# Altium footprint library Connectors.PcbLib: 245 footprints (part 5 of 16)
Each footprint in its own frame and in the unit in brackets; x right, y up, seen from the top. Pads: shape width x height; smd on the part's side, far side on the other; paste and mask are expansions set on the pad; w line width, h text height; cw(c..) or ccw(c..) is an arc to the next point about the centre after c.
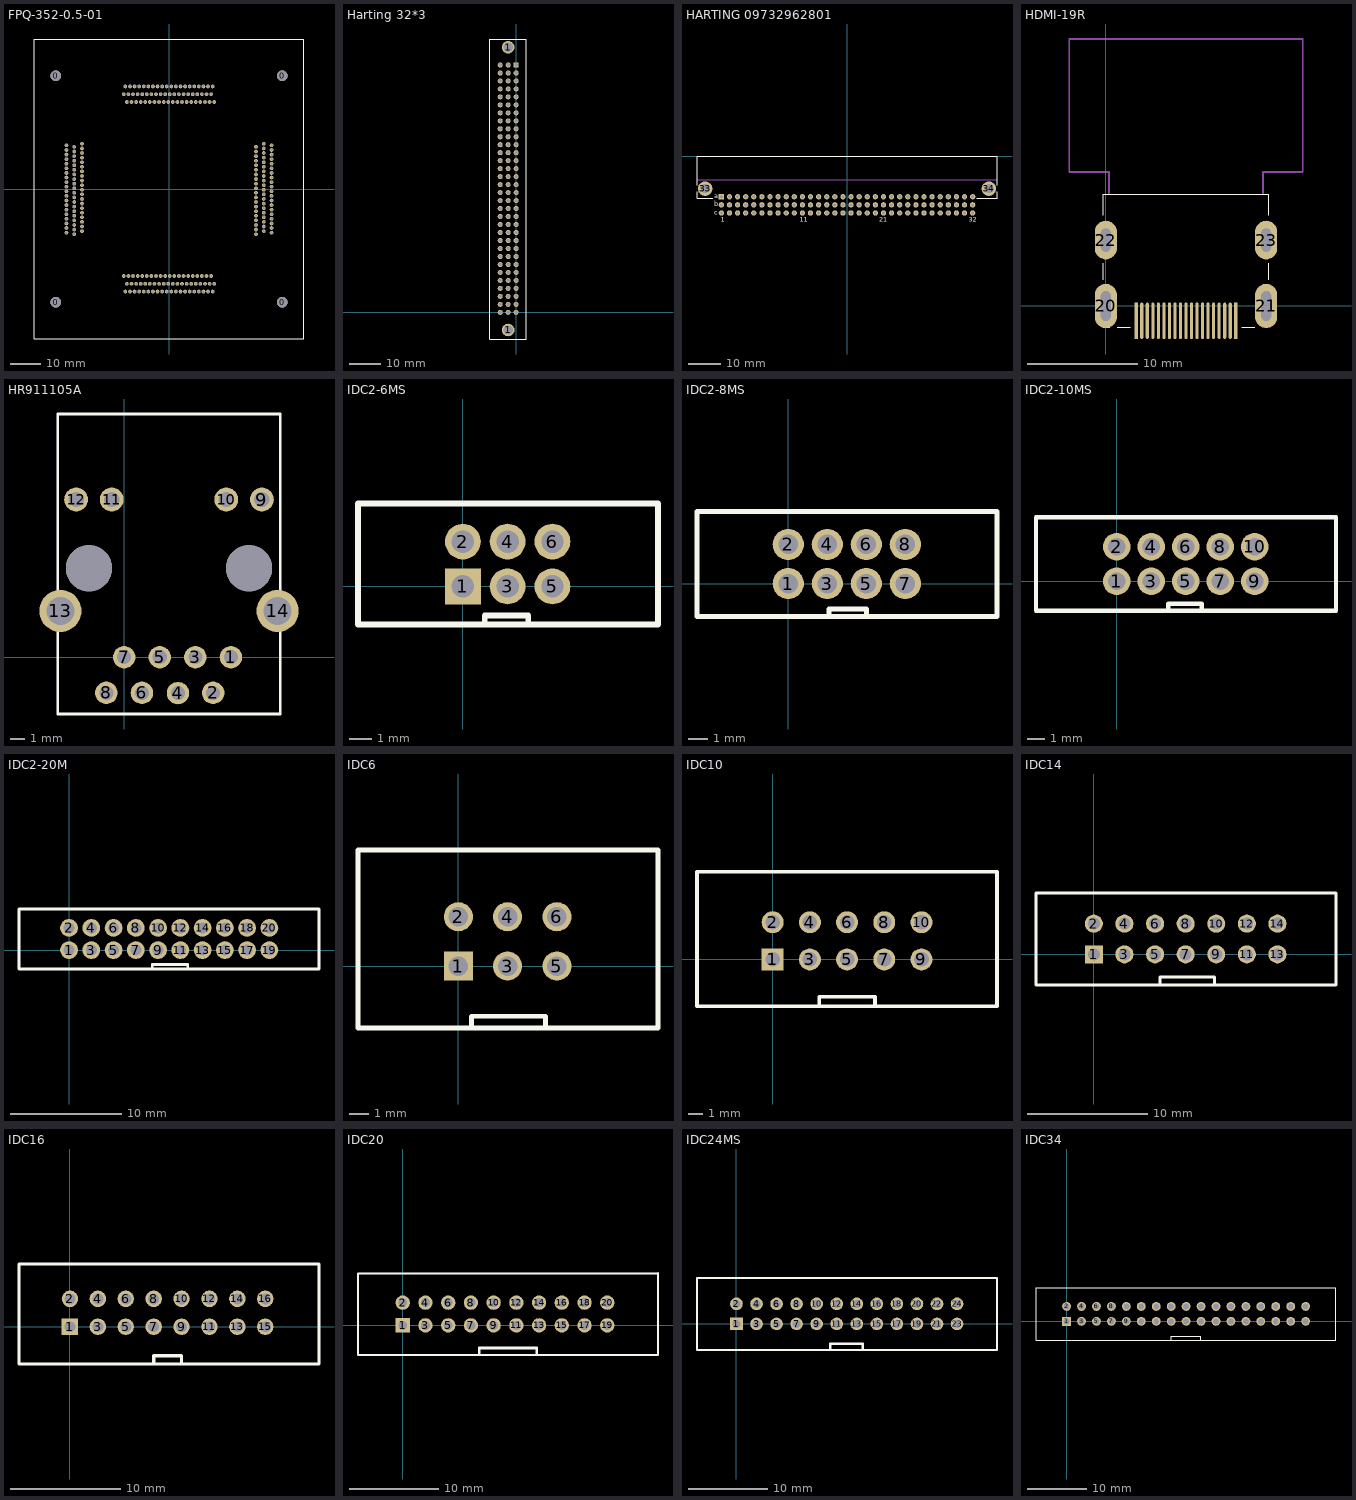
[diagram p4: the footprints below, top view; thin cyan lines are the x and y axes]

## FPQ-352-0.5-01 [mm] "IS_socket-240pin"
height 24
pads (244):
  round 3.5 hole 3.5: 0(-37,-37) 0(-37,37) 0(37,-37) 0(37,37)
  round 1.2 hole 0.8: 1(-14.75,-28.42) 2(-14.25,-33.5) 3(-13.75,-30.96) 4(-13.25,-28.42) 5(-12.75,-33.5) 6(-12.25,-30.96) 7(-11.75,-28.42) 8(-11.25,-33.5) 9(-10.75,-30.96) 10(-10.25,-28.42) 11(-9.75,-33.5) 12(-9.25,-30.96) 13(-8.75,-28.42) 14(-8.25,-33.5) 15(-7.75,-30.96) 16(-7.25,-28.42) 17(-6.75,-33.5) 18(-6.25,-30.96) 19(-5.75,-28.42) 20(-5.25,-33.5) 21(-4.75,-30.96) 22(-4.25,-28.42) 23(-3.75,-33.5) 24(-3.25,-30.96) 25(-2.75,-28.42) 26(-2.25,-33.5) 27(-1.75,-30.96) 28(-1.25,-28.42) 29(-0.75,-33.5) 30(-0.25,-30.96) 31(0.25,-28.42) 32(0.75,-33.5) 33(1.25,-30.96) 34(1.75,-28.42) 35(2.25,-33.5) 36(2.75,-30.96) 37(3.25,-28.42) 38(3.75,-33.5) 39(4.25,-30.96) 40(4.75,-28.42) 41(5.25,-33.5) 42(5.75,-30.96) 43(6.25,-28.42) 44(6.75,-33.5) 45(7.25,-30.96) 46(7.75,-28.42) 47(8.25,-33.5) 48(8.75,-30.96) 49(9.25,-28.42) 50(9.75,-33.5) 51(10.25,-30.96) 52(10.75,-28.42) 53(11.25,-33.5) 54(11.75,-30.96) 55(12.25,-28.42) 56(12.75,-33.5) 57(13.25,-30.96) 58(13.75,-28.42) 59(14.25,-33.5) 60(14.75,-30.96) 61(28.42,-14.75) 62(33.5,-14.25) 63(30.96,-13.75) 64(28.42,-13.25) 65(33.5,-12.75) 66(30.96,-12.25) 67(28.42,-11.75) 68(33.5,-11.25) 69(30.96,-10.75) 70(28.42,-10.25) 71(33.5,-9.75) 72(30.96,-9.25) 73(28.42,-8.75) 74(33.5,-8.25) 75(30.96,-7.75) 76(28.42,-7.25) 77(33.5,-6.75) 78(30.96,-6.25) 79(28.42,-5.75) 80(33.5,-5.25) 81(30.96,-4.75) 82(28.42,-4.25) 83(33.5,-3.75) 84(30.96,-3.25) 85(28.42,-2.75) 86(33.5,-2.25) 87(30.96,-1.75) 88(28.42,-1.25) 89(33.5,-0.75) 90(30.96,-0.25) 91(28.42,0.25) 92(33.5,0.75) 93(30.96,1.25) 94(28.42,1.75) 95(33.5,2.25) 96(30.96,2.75) 97(28.42,3.25) 98(33.5,3.75) 99(30.96,4.25) 100(28.42,4.75) 101(33.5,5.25) 102(30.96,5.75) 103(28.42,6.25) 104(33.5,6.75) 105(30.96,7.25) 106(28.42,7.75) 107(33.5,8.25) 108(30.96,8.75) 109(28.42,9.25) 110(33.5,9.75) 111(30.96,10.25) 112(28.42,10.75) 113(33.5,11.25) 114(30.96,11.75) 115(28.42,12.25) 116(33.5,12.75) 117(30.96,13.25) 118(28.42,13.75) 119(33.5,14.25) 120(30.96,14.75) 121(14.75,28.42) 122(14.25,33.5) 123(13.75,30.96) 124(13.25,28.42) 125(12.75,33.5) 126(12.25,30.96) 127(11.75,28.42) 128(11.25,33.5) 129(10.75,30.96) 130(10.25,28.42) 131(9.75,33.5) 132(9.25,30.96) 133(8.75,28.42) 134(8.25,33.5) 135(7.75,30.96) 136(7.25,28.42) 137(6.75,33.5) 138(6.25,30.96) 139(5.75,28.42) 140(5.25,33.5) 141(4.75,30.96) 142(4.25,28.42) 143(3.75,33.5) 144(3.25,30.96) 145(2.75,28.42) 146(2.25,33.5) 147(1.75,30.96) 148(1.25,28.42) 149(0.75,33.5) 150(0.25,30.96) 151(-0.25,28.42) 152(-0.75,33.5) 153(-1.25,30.96) 154(-1.75,28.42) 155(-2.25,33.5) 156(-2.75,30.96) 157(-3.25,28.42) 158(-3.75,33.5) 159(-4.25,30.96) 160(-4.75,28.42) 161(-5.25,33.5) 162(-5.75,30.96) 163(-6.25,28.42) 164(-6.75,33.5) 165(-7.25,30.96) 166(-7.75,28.42) 167(-8.25,33.5) 168(-8.75,30.96) 169(-9.25,28.42) 170(-9.75,33.5) 171(-10.25,30.96) 172(-10.75,28.42) 173(-11.25,33.5) 174(-11.75,30.96) 175(-12.25,28.42) 176(-12.75,33.5) 177(-13.25,30.96) 178(-13.75,28.42) 179(-14.25,33.5) 180(-14.75,30.96) 181(-28.42,14.75) 182(-33.5,14.25) 183(-30.96,13.75) 184(-28.42,13.25) 185(-33.5,12.75) 186(-30.96,12.25) 187(-28.42,11.75) 188(-33.5,11.25) 189(-30.96,10.75) 190(-28.42,10.25) 191(-33.5,9.75) 192(-30.96,9.25) 193(-28.42,8.75) 194(-33.5,8.25) 195(-30.96,7.75) 196(-28.42,7.25) 197(-33.5,6.75) 198(-30.96,6.25) 199(-28.42,5.75) 200(-33.5,5.25) 201(-30.96,4.75) 202(-28.42,4.25) 203(-33.5,3.75) 204(-30.96,3.25) 205(-28.42,2.75) 206(-33.5,2.25) 207(-30.96,1.75) 208(-28.42,1.25) 209(-33.5,0.75) 210(-30.96,0.25) 211(-28.42,-0.25) 212(-33.5,-0.75) 213(-30.96,-1.25) 214(-28.42,-1.75) 215(-33.5,-2.25) 216(-30.96,-2.75) 217(-28.42,-3.25) 218(-33.5,-3.75) 219(-30.96,-4.25) 220(-28.42,-4.75) 221(-33.5,-5.25) 222(-30.96,-5.75) 223(-28.42,-6.25) 224(-33.5,-6.75) 225(-30.96,-7.25) 226(-28.42,-7.75) 227(-33.5,-8.25) 228(-30.96,-8.75) 229(-28.42,-9.25) 230(-33.5,-9.75) 231(-30.96,-10.25) 232(-28.42,-10.75) 233(-33.5,-11.25) 234(-30.96,-11.75) 235(-28.42,-12.25) 236(-33.5,-12.75) 237(-30.96,-13.25) 238(-28.42,-13.75) 239(-33.5,-14.25) 240(-30.96,-14.75)
Top Overlay:
  lines w0.1: -44,-49 44,-49 44,49 -44,49 -44,-49
3D body: height 24, standoff 0, extent -44,-49 44,49

## Harting 32*3 [mm]
pads (98):
  round 4 hole 3: 1(-2.54,-5.63) 1(-2.54,84.37)
  rect 1.6x1.6 hole 1.1: a1(0,78.74)
  round 1.6 hole 1.1: a2(0,76.2) a3(0,73.66) a4(0,71.12) a5(0,68.58) a6(0,66.04) a7(0,63.5) a8(0,60.96) a9(0,58.42) a10(0,55.88) a11(0,53.34) a12(0,50.8) a13(0,48.26) a14(0,45.72) a15(0,43.18) a16(0,40.64) a17(0,38.1) a18(0,35.56) a19(0,33.02) a20(0,30.48) a21(0,27.94) a22(0,25.4) a23(0,22.86) a24(0,20.32) a25(0,17.78) a26(0,15.24) a27(0,12.7) a28(0,10.16) a29(0,7.62) a30(0,5.08) a31(0,2.54) a32(0,0) b1(-2.54,78.74) b2(-2.54,76.2) b3(-2.54,73.66) b4(-2.54,71.12) b5(-2.54,68.58) b6(-2.54,66.04) b7(-2.54,63.5) b8(-2.54,60.96) b9(-2.54,58.42) b10(-2.54,55.88) b11(-2.54,53.34) b12(-2.54,50.8) b13(-2.54,48.26) b14(-2.54,45.72) b15(-2.54,43.18) b16(-2.54,40.64) b17(-2.54,38.1) b18(-2.54,35.56) b19(-2.54,33.02) b20(-2.54,30.48) b21(-2.54,27.94) b22(-2.54,25.4) b23(-2.54,22.86) b24(-2.54,20.32) b25(-2.54,17.78) b26(-2.54,15.24) b27(-2.54,12.7) b28(-2.54,10.16) b29(-2.54,7.62) b30(-2.54,5.08) b31(-2.54,2.54) b32(-2.54,0) c1(-5.08,78.74) c2(-5.08,76.2) c3(-5.08,73.66) c4(-5.08,71.12) c5(-5.08,68.58) c6(-5.08,66.04) c7(-5.08,63.5) c8(-5.08,60.96) c9(-5.08,58.42) c10(-5.08,55.88) c11(-5.08,53.34) c12(-5.08,50.8) c13(-5.08,48.26) c14(-5.08,45.72) c15(-5.08,43.18) c16(-5.08,40.64) c17(-5.08,38.1) c18(-5.08,35.56) c19(-5.08,33.02) c20(-5.08,30.48) c21(-5.08,27.94) c22(-5.08,25.4) c23(-5.08,22.86) c24(-5.08,20.32) c25(-5.08,17.78) c26(-5.08,15.24) c27(-5.08,12.7) c28(-5.08,10.16) c29(-5.08,7.62) c30(-5.08,5.08) c31(-5.08,2.54) c32(-5.08,0)
Top Overlay:
  lines w0.254: -8.4,-8.5 -8.4,87 3.2,87 3.2,-8.5 -8.4,-8.5

## HARTING 09732962801 [mm] "Connector; DIN 41612"
height 11.1
pads (98):
  round 4.6 hole 2.8: 33(-44.45,-10.1) 34(44.45,-10.1)
  rect 1.65x1.65 hole 1: A1(-39.37,-12.64)
  round 1.65 hole 1: A2(-36.83,-12.64) A3(-34.29,-12.64) A4(-31.75,-12.64) A5(-29.21,-12.64) A6(-26.67,-12.64) A7(-24.13,-12.64) A8(-21.59,-12.64) A9(-19.05,-12.64) A10(-16.51,-12.64) A11(-13.97,-12.64) A12(-11.43,-12.64) A13(-8.89,-12.64) A14(-6.35,-12.64) A15(-3.81,-12.64) A16(-1.27,-12.64) A17(1.27,-12.64) A18(3.81,-12.64) A19(6.35,-12.64) A20(8.89,-12.64) A21(11.43,-12.64) A22(13.97,-12.64) A23(16.51,-12.64) A24(19.05,-12.64) A25(21.59,-12.64) A26(24.13,-12.64) A27(26.67,-12.64) A28(29.21,-12.64) A29(31.75,-12.64) A30(34.29,-12.64) A31(36.83,-12.64) A32(39.37,-12.64) B1(-39.37,-15.18) B2(-36.83,-15.18) B3(-34.29,-15.18) B4(-31.75,-15.18) B5(-29.21,-15.18) B6(-26.67,-15.18) B7(-24.13,-15.18) B8(-21.59,-15.18) B9(-19.05,-15.18) B10(-16.51,-15.18) B11(-13.97,-15.18) B12(-11.43,-15.18) B13(-8.89,-15.18) B14(-6.35,-15.18) B15(-3.81,-15.18) B16(-1.27,-15.18) B17(1.27,-15.18) B18(3.81,-15.18) B19(6.35,-15.18) B20(8.89,-15.18) B21(11.43,-15.18) B22(13.97,-15.18) B23(16.51,-15.18) B24(19.05,-15.18) B25(21.59,-15.18) B26(24.13,-15.18) B27(26.67,-15.18) B28(29.21,-15.18) B29(31.75,-15.18) B30(34.29,-15.18) B31(36.83,-15.18) B32(39.37,-15.18) C1(-39.37,-17.72) C2(-36.83,-17.72) C3(-34.29,-17.72) C4(-31.75,-17.72) C5(-29.21,-17.72) C6(-26.67,-17.72) C7(-24.13,-17.72) C8(-21.59,-17.72) C9(-19.05,-17.72) C10(-16.51,-17.72) C11(-13.97,-17.72) C12(-11.43,-17.72) C13(-8.89,-17.72) C14(-6.35,-17.72) C15(-3.81,-17.72) C16(-1.27,-17.72) C17(1.27,-17.72) C18(3.81,-17.72) C19(6.35,-17.72) C20(8.89,-17.72) C21(11.43,-17.72) C22(13.97,-17.72) C23(16.51,-17.72) C24(19.05,-17.72) C25(21.59,-17.72) C26(24.13,-17.72) C27(26.67,-17.72) C28(29.21,-17.72) C29(31.75,-17.72) C30(34.29,-17.72) C31(36.83,-17.72) C32(39.37,-17.72)
Top Overlay:
  lines w0.2: -47,-11.1 -47,-13.14 -42.07,-13.14 ; -47,-9.1 -47,0 47,0 47,-9.1 ; 40.595,-13.14 47,-13.14 47,-11.1
  text "21" at 10.18,-20.42 h1.5
  text "11" at -14.845,-20.42 h1.5
  text "32" at 38.12,-20.42 h1.5
  text "c" at -41.58,-18.22 h1.5
  text "b" at -41.58,-15.68 h1.5
  text "a" at -41.58,-13.14 h1.5
  text "1" at -39.62,-20.42 h1.5
Mechanical 1:
  lines w0.1: -47,-7.34 47,-7.34
  text "PCB Edge" at -46.47,-6.84 h0.6
3D body "09 73 296 2801.STP": height 9.17, standoff -2.73, extent -47.03,-18.05 46.97,0.07

## HDMI-19R [mm]
pads (23):
  rect 0.28x3.3 smd: 1(2.75,-1.335) 19(11.75,-1.335)
  oval 0.28x3.3 smd: 2(3.25,-1.335) 3(3.75,-1.335) 4(4.25,-1.335) 5(4.75,-1.335) 6(5.25,-1.335) 7(5.75,-1.335) 8(6.25,-1.335) 9(6.75,-1.335) 10(7.25,-1.335) 11(7.75,-1.335) 12(8.25,-1.335) 13(8.75,-1.335) 14(9.25,-1.335) 15(9.75,-1.335) 16(10.25,-1.335) 17(10.75,-1.335) 18(11.25,-1.335)
  oval 2x4 hole 0.9 slot 2.7 at 90 deg: 20(0,0) 21(14.5,0)
  oval 2x3.5 hole 0.9 slot 2.1 at 90 deg: 22(0,5.96) 23(14.5,5.96)
Top Overlay:
  lines w0.1: -0.25,-1.91 0.369,-1.91 ; -0.25,2.36 -0.25,3.85 ; -0.25,8.225 -0.25,10.09 14.75,10.09 14.75,8.225 ; 1.025,-1.91 2.225,-1.91 ; 12.275,-1.91 13.475,-1.91 ; 14.75,2.36 14.75,3.85
Mechanical 1:
  lines w0.15: 0.293,10.217 0.293,12.118 -3.3,12.118 -3.3,24.142 17.8,24.142 17.8,12.118 14.207,12.118 14.207,10.217
  text "Габбариты ответной части" at -0.722,21.97 h1.6
3D body "1747981-1.stp": height 6.03, standoff -2.25, extent -0.25,-1.91 14.75,10.09

## HR911105A [mm]
pads (16):
  round 1.6 hole 1: 1(7.62,0) 2(6.35,-2.54) 3(5.08,0) 4(3.84,-2.56) 5(2.54,0) 6(1.27,-2.54) 7(0,0) 8(-1.27,-2.54)
  round 1.7 hole 1.1: 9(9.825,11.25) 10(7.285,11.25) 11(-0.885,11.25) 12(-3.425,11.25)
  round 3 hole 2: 13(-4.545,3.3) 14(10.945,3.3)
  round 3.3 hole 3.3: ""(-2.515,6.35) ""(8.915,6.35)
Top Overlay:
  lines w0.2: 3.2,-2.56 3.84,-2.56 ; -4.74,-4.05 -4.74,17.35 3.2,17.35 11.14,17.35 11.14,-4.05 3.2,-4.05 -4.74,-4.05
3D body "User Library-HR911105A.step": height 14, standoff -2.5, extent -4.78,-4.1 11.1,17.3

## IDC2-6MS [mm]
pads (6):
  rect 1.6x1.6 hole 1: 1(0,0)
  round 1.6 hole 1: 2(0,2) 3(2,0) 4(2,2) 5(4,0) 6(4,2)
Top Overlay:
  lines w0.254: 0.98,-1.7 0.98,-1.3 2.92,-1.3 2.92,-1.67 ; 8.7,-1.7 -4.68,-1.7 -4.68,3.7 8.7,3.7 ; 8.71,-1.7 8.71,3.7
3D body: height 1.4, standoff 0, extent -4.5,-1.7 8.5,3.8
3D body: height 5.4, standoff -1.5, extent 3.74,-0.26 4.26,0.26
3D body: height 5.4, standoff -1.5, extent 3.74,1.74 4.26,2.26
3D body: height 5.4, standoff -1.5, extent 1.74,-0.26 2.26,0.26
3D body: height 5.4, standoff -1.5, extent 1.74,1.74 2.26,2.26
3D body: height 5.4, standoff -1.5, extent -0.26,-0.26 0.26,0.26
3D body: height 5.4, standoff -1.5, extent -0.26,1.74 0.26,2.26
3D body: height 2.5, standoff 0, extent -4.5,-1.8 8.5,-1.48
3D body: height 5.7, standoff 0, extent 8.18,-1.8 8.5,3.8
3D body: height 5.7, standoff 0, extent -4.5,-1.8 -4.18,3.8
3D body: height 5.7, standoff 0, extent 2.97,-1.8 8.5,-1.48
3D body: height 5.7, standoff 0, extent -4.5,-1.8 1.03,-1.48
3D body: height 5.7, standoff 0, extent -4.5,3.48 8.5,3.8

## IDC2-8MS [mm]
pads (8):
  round 1.6 hole 1: 1(0,0) 2(0,2) 3(2,0) 4(2,2) 5(4,0) 6(4,2) 7(6,0) 8(6,2)
Top Overlay:
  lines w0.254: 2.08,-1.7 2.08,-1.3 4.02,-1.3 4.02,-1.67 ; -4.68,-1.7 10.7,-1.7 10.7,3.7 -4.68,3.7 -4.68,-1.7
3D body "User Library-BHS2-8.STEP": height 7.2, standoff -2, extent -4.6,-1.75 10.6,3.75

## IDC2-10MS [mm]
pads (10):
  round 1.6 hole 1: 1(0,0) 2(0,2) 3(2,0) 4(2,2) 5(4,0) 6(4,2) 7(6,0) 8(6,2) 9(8,0) 10(8,2)
Top Overlay:
  lines w0.254: 2.98,-1.7 2.98,-1.3 4.92,-1.3 4.92,-1.67 ; -4.68,-1.7 -4.68,3.7 12.71,3.7 12.71,-1.7 -4.68,-1.7
3D body "User Library-IDC2-10.step": height 5.6, standoff -3.6, extent -4.54,-1.78 12.56,3.72

## IDC2-20M [mm]
pads (20):
  round 1.6 hole 1: 1(0,0) 2(0,2) 3(2,0) 4(2,2) 5(4,0) 6(4,2) 7(6,0) 8(6,2) 9(8,0) 10(8,2) 11(10,0) 12(10,2) 13(12,0) 14(12,2) 15(14,0) 16(14,2) 17(16,0) 18(16,2) 19(18,0) 20(18,2)
Top Overlay:
  lines w0.254: 7.48,-1.7 7.48,-1.3 10.67,-1.3 10.67,-1.67 ; -4.5,-1.7 -4.5,3.7 22.46,3.7 22.46,-1.7 -4.5,-1.7
3D body "User Library-BH2-xx10-64.step": height 5.65, standoff -3.6, extent -4.5,-1.755 22.5,3.695

## IDC6 [mm]
height 10
pads (6):
  rect 1.5x1.5 hole 1: 1(0,0)
  round 1.5 hole 1: 2(0,2.54) 3(2.54,0) 4(2.54,2.54) 5(5.08,0) 6(5.08,2.54)
Top Overlay:
  lines w0.254: 0.69,-3.17 0.69,-2.585 4.5,-2.585 4.5,-3.14 ; -5.17,-3.19 -5.17,5.98 10.29,5.98 10.29,-3.19 -5.17,-3.19
3D body "User Library-Header2x3-shrouded-vertical.step": height 9.1, standoff -3.1, extent -5.11,-3.085 10.13,6.365

## IDC10 [mm]
height 10
pads (10):
  rect 1.5x1.5 hole 1: 1(0,0)
  round 1.5 hole 1: 2(0,2.54) 3(2.54,0) 4(2.54,2.54) 5(5.08,0) 6(5.08,2.54) 7(7.62,0) 8(7.62,2.54) 9(10.16,0) 10(10.16,2.54)
Top Overlay:
  lines w0.254: 3.175,-3.14 3.175,-2.555 6.985,-2.555 6.985,-3.11 ; -5.17,-3.19 15.32,-3.19 15.32,5.98 -5.17,5.98 -5.17,-3.19
3D body "User Library-BH-10__64.step": height 9.1, standoff -3, extent -5.13,-3.35 15.37,5.95

## IDC14 [mm]
height 10
pads (14):
  rect 1.5x1.5 hole 1: 1(0,0)
  round 1.5 hole 1: 2(0,2.54) 3(2.54,0) 4(2.54,2.54) 5(5.08,0) 6(5.08,2.54) 7(7.62,0) 8(7.62,2.54) 9(10.16,0) 10(10.16,2.54) 11(12.7,0) 12(12.7,2.54) 13(15.24,0) 14(15.24,2.54)
Top Overlay:
  lines w0.254: 5.5,-2.54 5.5,-1.9 10,-1.9 10,-2.54 ; -4.8,-2.54 20.1,-2.54 20.1,5.08 -4.8,5.08 -4.8,-2.54
3D body "User Library-DS1013-14S (IDC-14MS CONNFLY).step": height 9, standoff -3.6, extent -5.147,-3.219 20.433,5.681

## IDC16 [mm]
pads (16):
  rect 1.5x1.5 hole 1: 1(0,0)
  round 1.5 hole 1: 2(0,2.54) 3(2.54,0) 4(2.54,2.54) 5(5.08,0) 6(5.08,2.54) 7(7.62,0) 8(7.62,2.54) 9(10.16,0) 10(10.16,2.54) 11(12.7,0) 12(12.7,2.54) 13(15.24,0) 14(15.24,2.54) 15(17.78,0) 16(17.78,2.54)
Top Overlay:
  lines w0.254: -4.64,-3.4 -4.64,5.72 22.67,5.72 22.67,-3.4 -4.64,-3.4
  lines w0.3: 7.62,-3.33 7.62,-2.65 10.16,-2.65 10.16,-3.34
3D body "User Library-User Library-IDC-16M.STEP": height 9.3, standoff -3.1, extent -5.13,-3.15 22.87,5.95

## IDC20 [mm]
height 10
pads (20):
  rect 1.6x1.6 hole 1: 1(0,0)
  round 1.6 hole 1: 2(0,2.54) 3(2.54,0) 4(2.54,2.54) 5(5.08,0) 6(5.08,2.54) 7(7.62,0) 8(7.62,2.54) 9(10.16,0) 10(10.16,2.54) 11(12.7,0) 12(12.7,2.54) 13(15.24,0) 14(15.24,2.54) 15(17.78,0) 16(17.78,2.54) 17(20.32,0) 18(20.32,2.54) 19(22.86,0) 20(22.86,2.54)
Top Overlay:
  lines w0.254: 28.5,5.8 -5,5.8 -5,-3.3 28.53,-3.3 ; 28.53,-3.26 28.53,5.84
  lines w0.3: 8.54,-3.2 8.54,-2.53 14.97,-2.53 14.97,-3.2
3D body "User Library-BH-20.step": height 8.75, standoff -3.1, extent -5.08,-3.05 27.94,6.05

## IDC24MS [mm]
height 10
pads (24):
  rect 1.6x1.6 hole 1: 1(0,0)
  round 1.6 hole 1: 2(0,2.54) 3(2.54,0) 4(2.54,2.54) 5(5.08,0) 6(5.08,2.54) 7(7.62,0) 8(7.62,2.54) 9(10.16,0) 10(10.16,2.54) 11(12.7,0) 12(12.7,2.54) 13(15.24,0) 14(15.24,2.54) 15(17.78,0) 16(17.78,2.54) 17(20.32,0) 18(20.32,2.54) 19(22.86,0) 20(22.86,2.54) 21(25.4,0) 22(25.4,2.54) 23(27.94,0) 24(27.94,2.54)
Top Overlay:
  lines w0.254: -5,-3.3 -5,5.8 33,5.8 33,-3.3 -5,-3.3
  lines w0.3: 11.9,-3.2 11.9,-2.5 16,-2.5 16,-3.2
3D body: height 7.5, standoff -1.5, extent 24.894,-0.568 25.89,0.43
3D body: height 7.5, standoff -1.5, extent 24.894,2.071 25.89,3.069
3D body: height 7.5, standoff -1.5, extent 27.406,2.032 28.402,3.03
3D body: height 7.5, standoff -1.5, extent 27.406,-0.568 28.402,0.43
3D body: height 7.5, standoff -1.5, extent 12.204,-0.598 13.2,0.4
3D body: height 7.5, standoff -1.5, extent 12.204,2.041 13.2,3.039
3D body: height 7.5, standoff -1.5, extent 14.716,2.002 15.712,3
3D body: height 7.5, standoff -1.5, extent 14.716,-0.598 15.712,0.4
3D body: height 7.5, standoff -1.5, extent 17.276,2.002 18.272,3
3D body: height 7.5, standoff -1.5, extent 17.276,-0.598 18.272,0.4
3D body: height 7.5, standoff -1.5, extent 19.816,2.052 20.812,3.05
3D body: height 7.5, standoff -1.5, extent 19.816,-0.598 20.812,0.4
3D body: height 7.5, standoff -1.5, extent 22.316,2.002 23.312,3
3D body: height 7.5, standoff -1.5, extent 22.316,-0.598 23.312,0.4
3D body: height 1, standoff 0, extent -4.34,-2.62 32.27,5.3
3D body: height 7.5, standoff -1.5, extent 9.624,-0.579 10.62,0.419
3D body: height 7.5, standoff -1.5, extent 9.624,2.021 10.62,3.019
3D body: height 7.5, standoff -1.5, extent 7.124,-0.579 8.12,0.419
3D body: height 7.5, standoff -1.5, extent 7.124,2.071 8.12,3.069
3D body: height 7.5, standoff -1.5, extent 4.584,-0.579 5.58,0.419
3D body: height 7.5, standoff -1.5, extent 4.584,2.021 5.58,3.019
3D body: height 7.5, standoff -1.5, extent 2.024,-0.579 3.02,0.419
3D body: height 7.5, standoff -1.5, extent 2.024,2.021 3.02,3.019
3D body: height 7.5, standoff -1.5, extent -0.488,2.06 0.508,3.058
3D body: height 7.5, standoff -1.5, extent -0.488,-0.579 0.508,0.419
3D body: height 8, standoff 0, extent -5.01,-3.3 33,5.82
3D body: height 2, standoff 0, extent 12.06,-3.27 15.82,-2.08

## IDC34 [mm]
pads (34):
  rect 1.5x1.5 hole 1: 1(0,0)
  round 1.5 hole 1: 2(0,2.54) 3(2.54,0) 4(2.54,2.54) 5(5.08,0) 6(5.08,2.54) 7(7.62,0) 8(7.62,2.54) 9(10.16,0) 10(10.16,2.54) 11(12.7,0) 12(12.7,2.54) 13(15.24,0) 14(15.24,2.54) 15(17.78,0) 16(17.78,2.54) 17(20.32,0) 18(20.32,2.54) 19(22.86,0) 20(22.86,2.54) 21(25.4,0) 22(25.4,2.54) 23(27.94,0) 24(27.94,2.54) 25(30.48,0) 26(30.48,2.54) 27(33.02,0) 28(33.02,2.54) 29(35.56,0) 30(35.56,2.54) 31(38.1,0) 32(38.1,2.54) 33(40.64,0) 34(40.64,2.54)
Top Overlay:
  lines w0.1: 17.8,-3.2 17.8,-2.5 22.8,-2.5 22.8,-3.2 ; -5.2,-3.2 45.8,-3.2 45.8,5.7 -5.2,5.7 -5.2,-3.2
3D body "User Library-DS1013-34S (IDC-34MS CONNFLY).step": height 9, standoff -3.6, extent -5.17,-3.23 45.81,5.67